# Altium schematic symbol library LATTICEPLDS_Library.SchLib: 291 symbols (part 31 of 32) (continued)
## ORLI10G (continued)
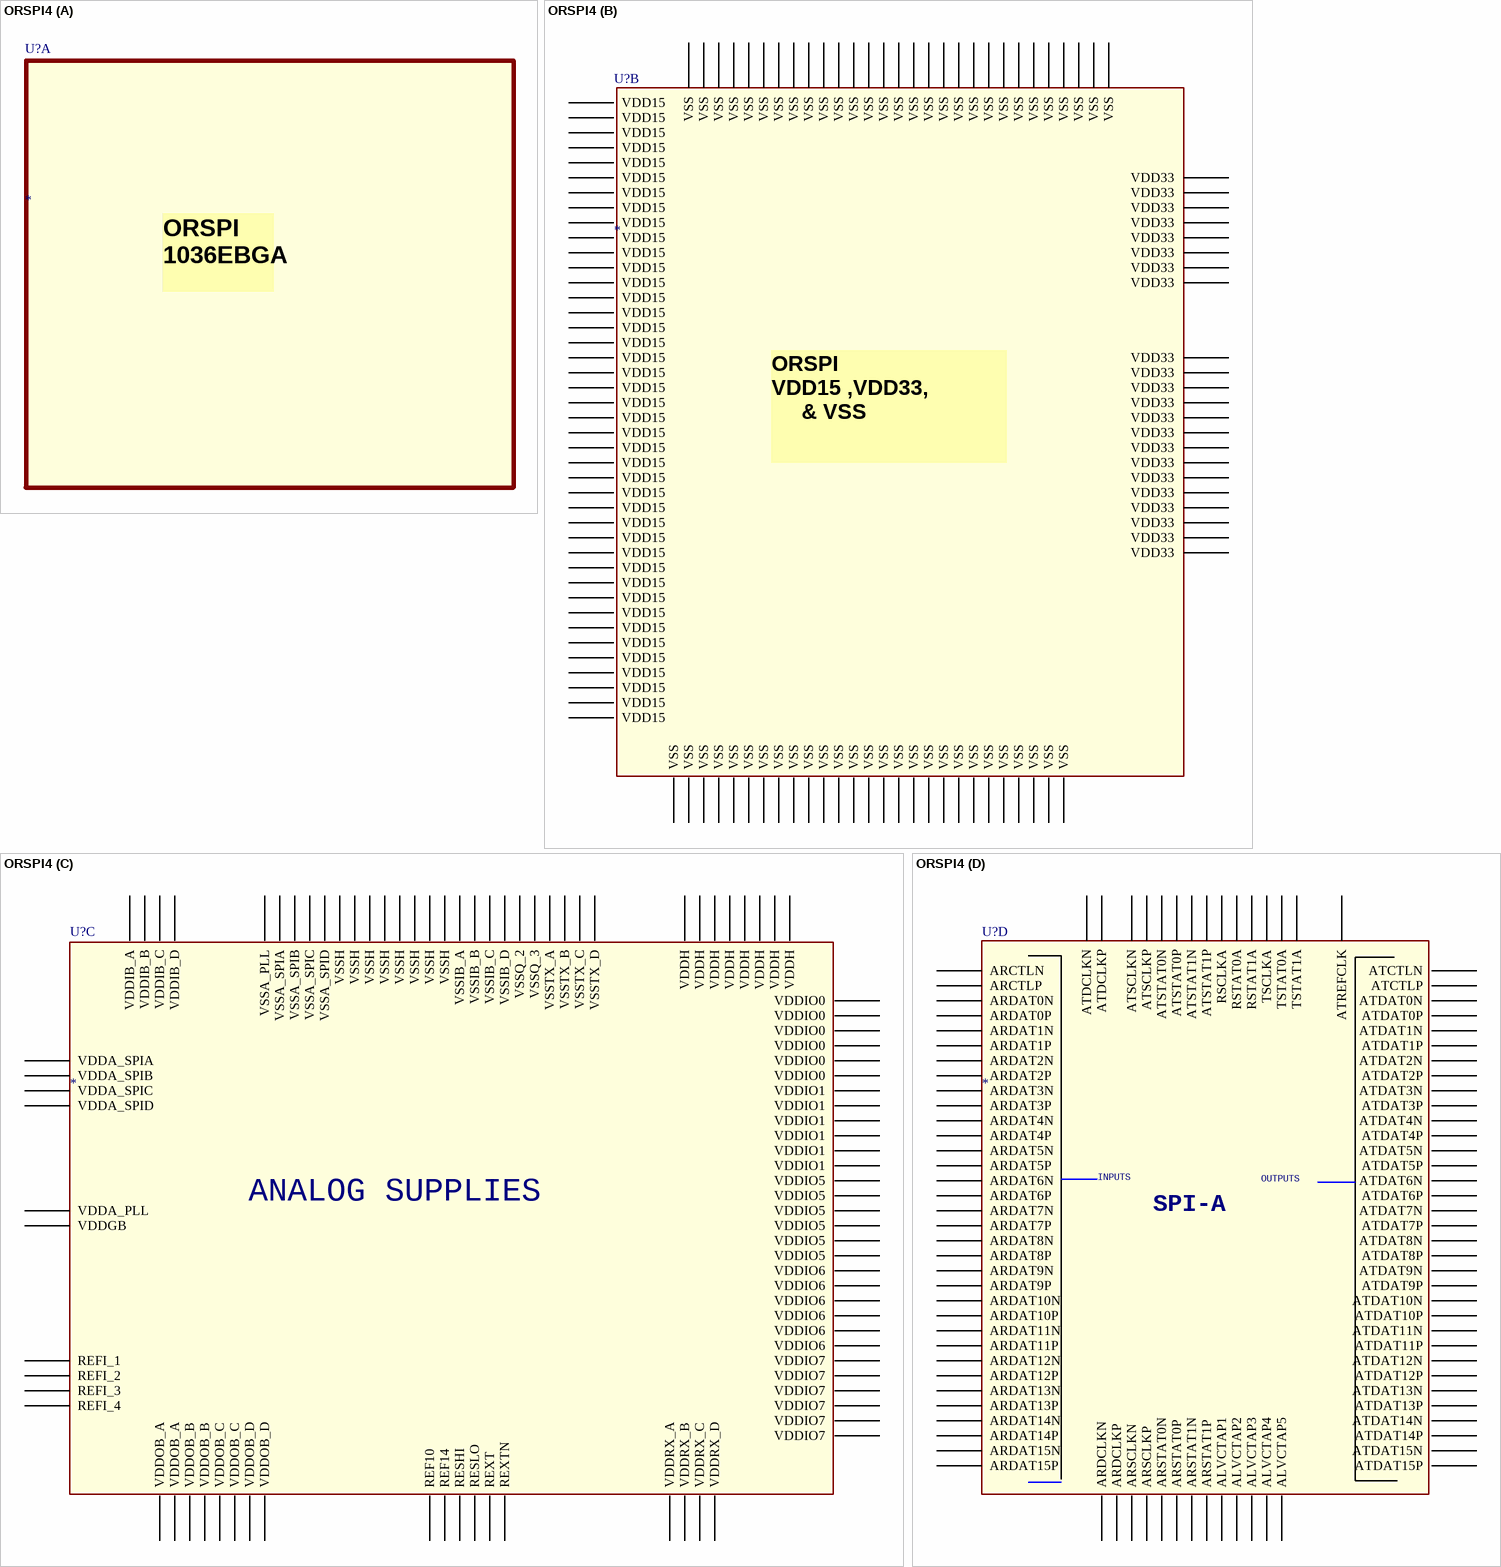
[diagram p291: symbol ORSPI4]
part P text: 3.3 VOLT PINS; 1.5 VOLT PINS; GROUND PINS
part Q text: TC; TL; CL; BL; BC

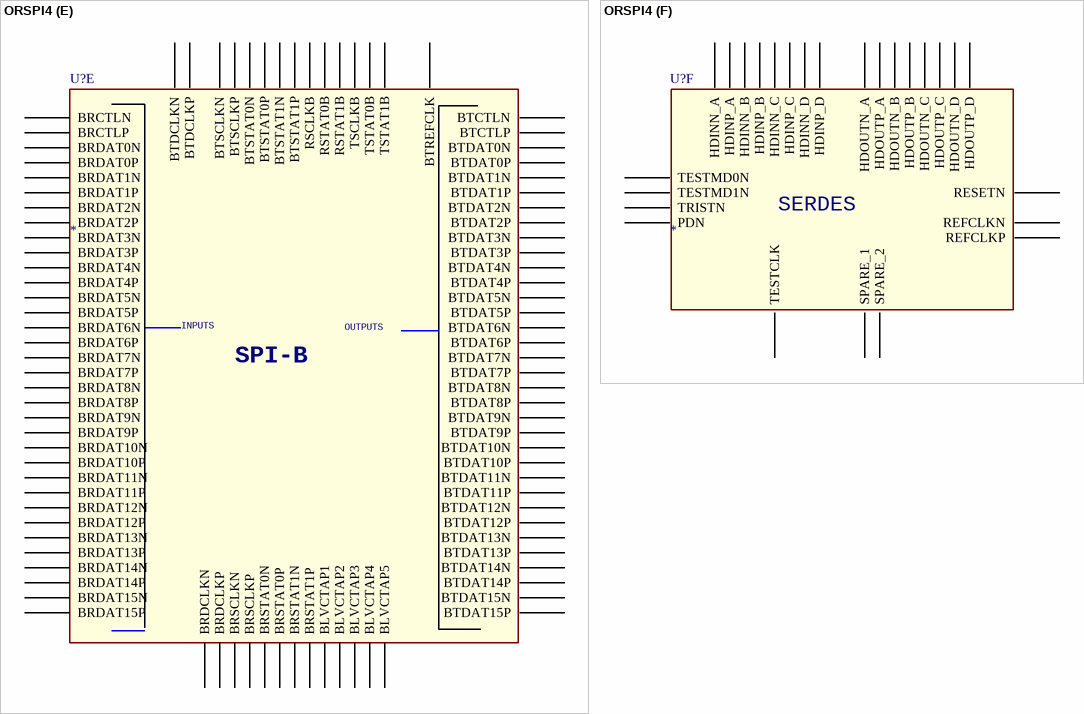
[diagram p292: symbol ORSPI4]

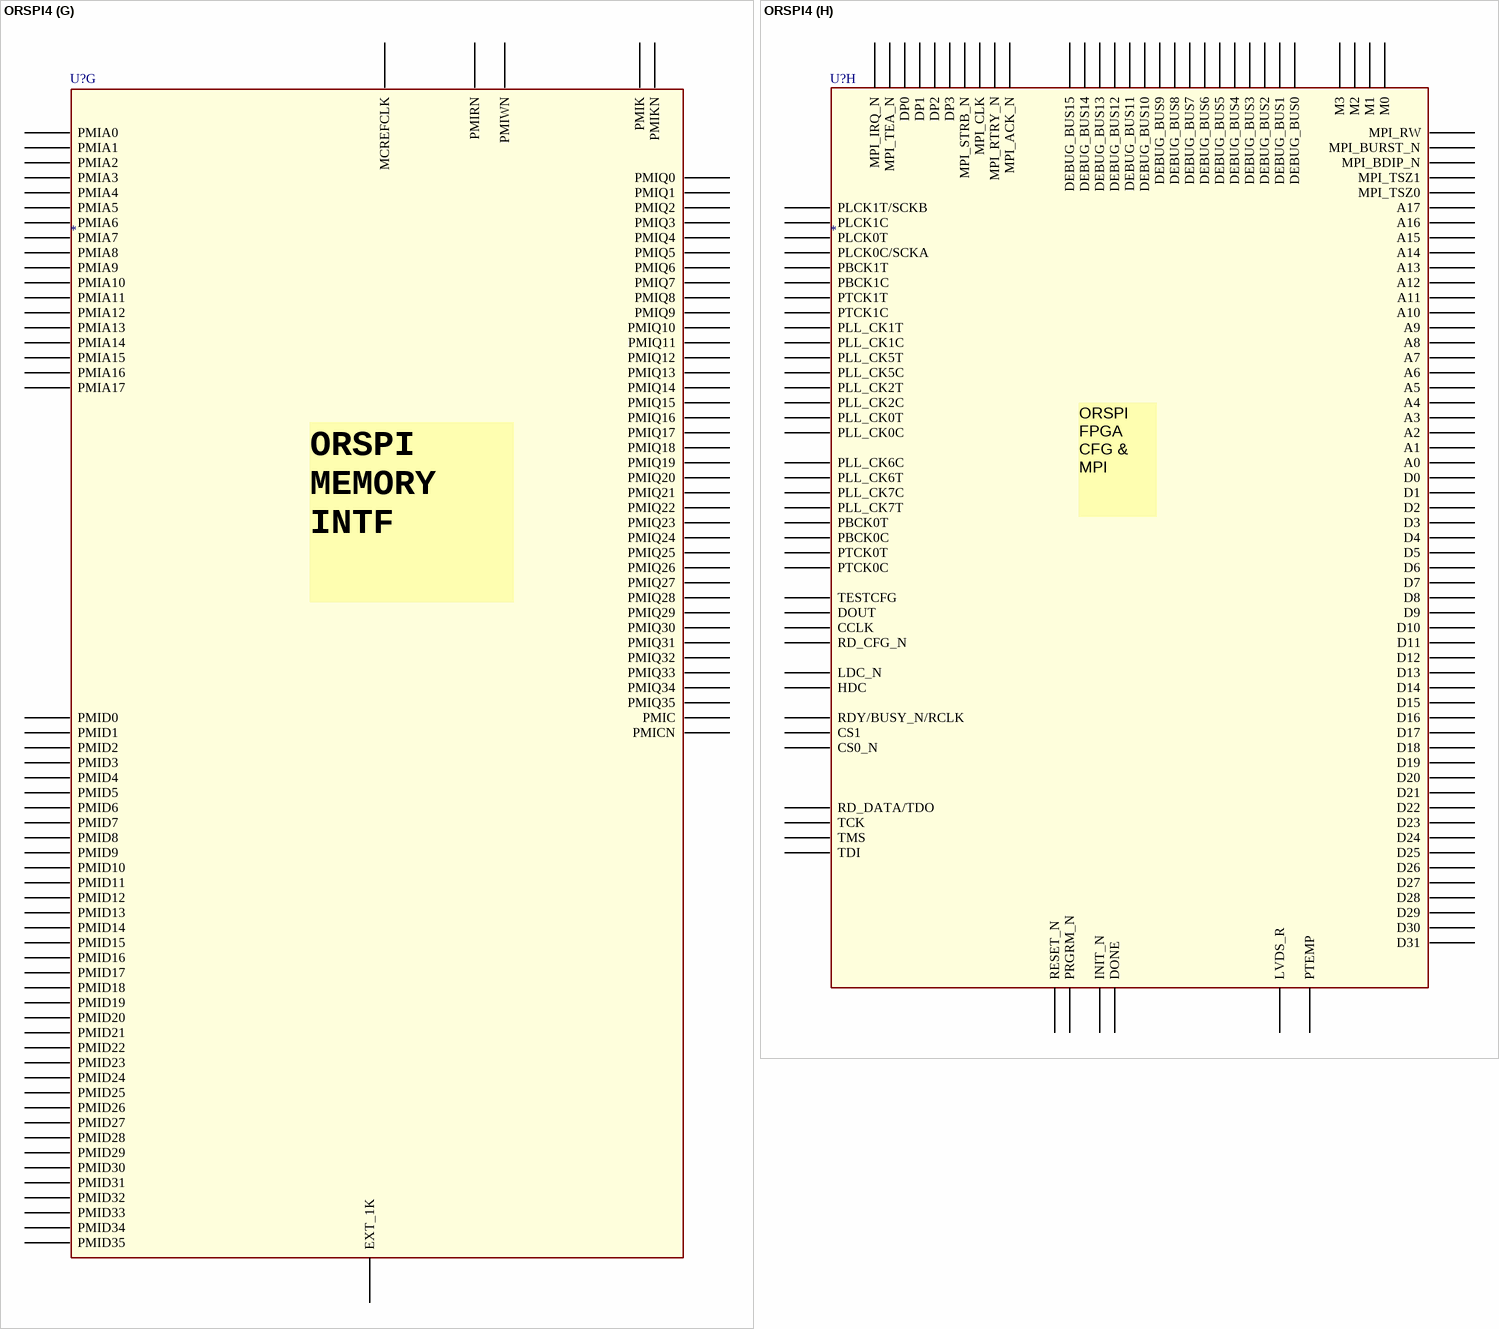
[diagram p293: symbol ORSPI4]

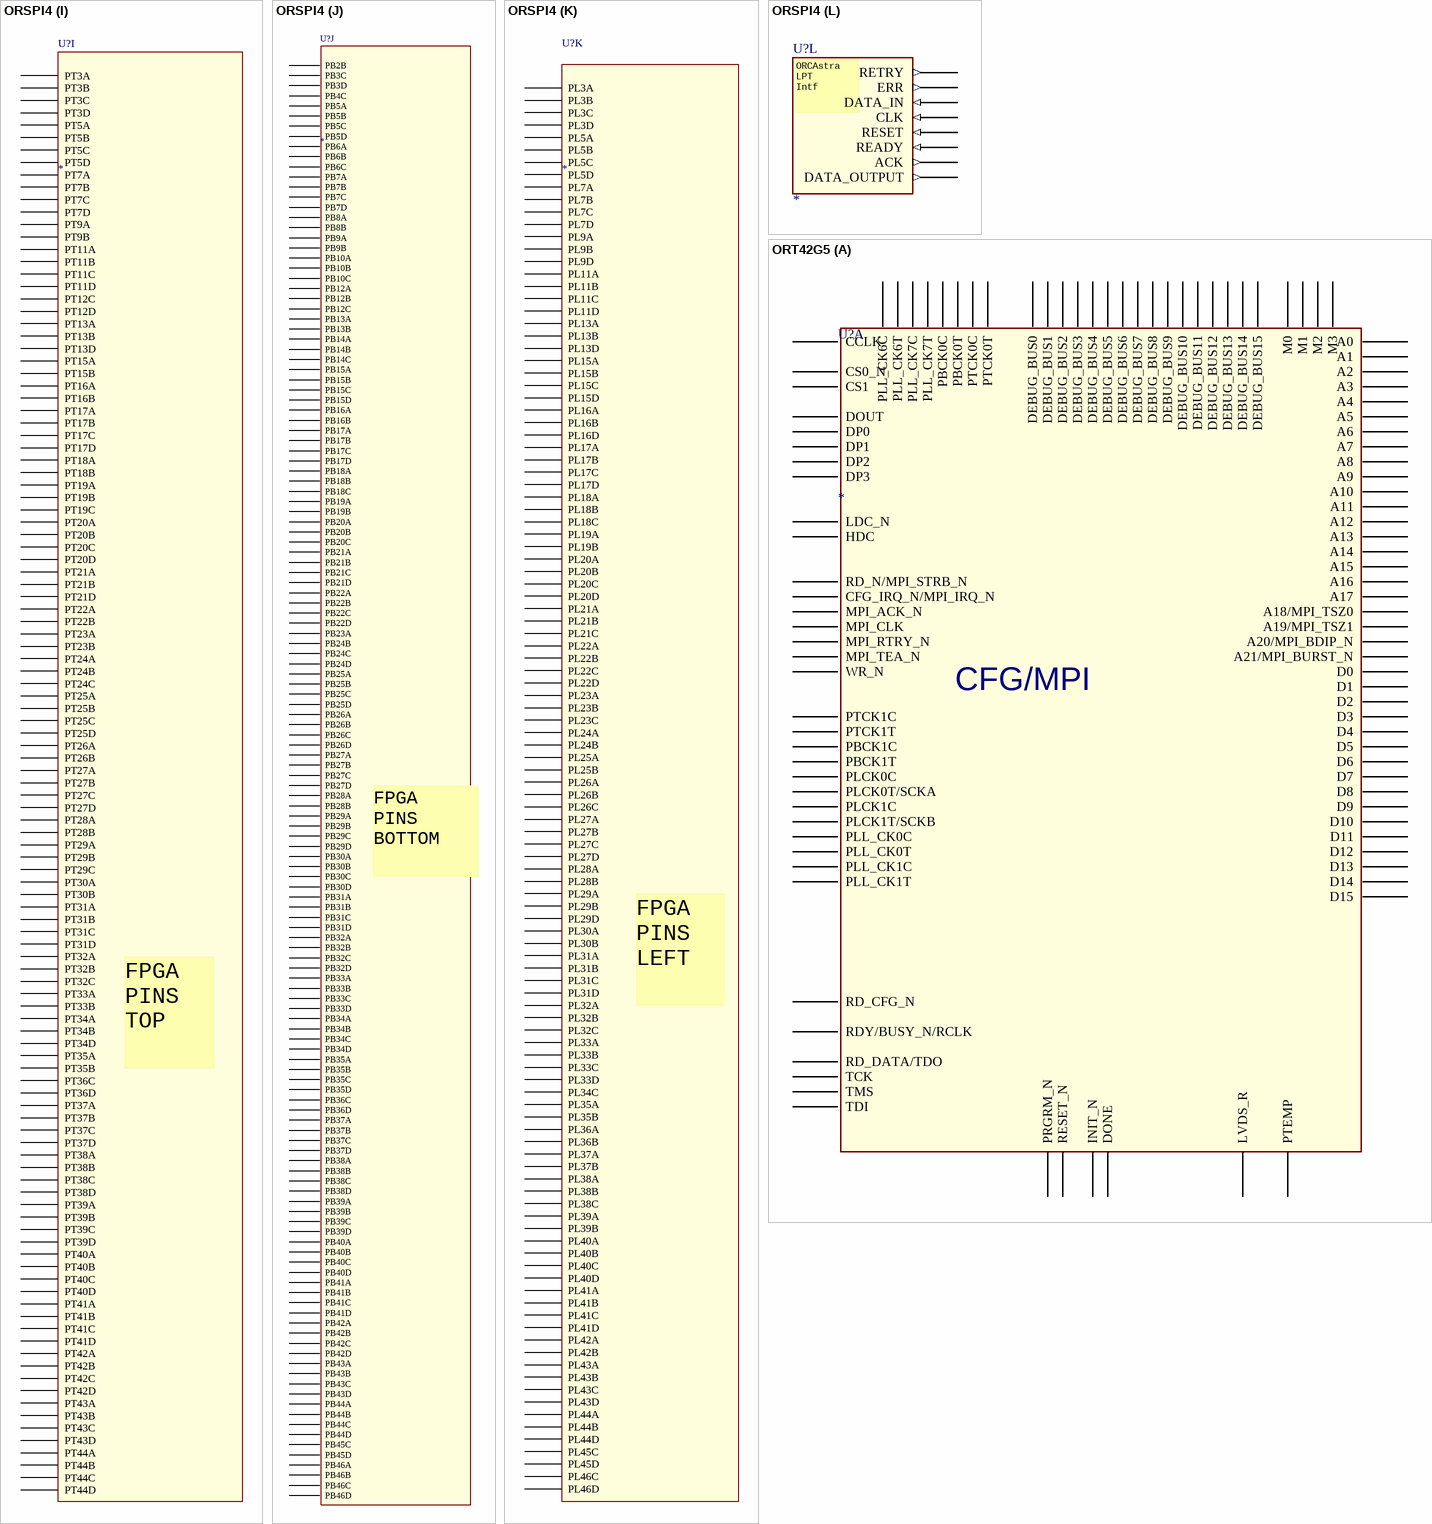
[diagram p294: symbols ORSPI4 to ORT42G5]

## ORSPI4
designator U?
footprint 1036fsbga
part B pins: A1 VSS (power), A2 VSS (power), A11 VSS (power), A19 VDD33 (power), A22 VSS (power), A33 VSS (power), A43 VSS (power), A44 VSS (power), AA7 VSS (power), AA38 VSS (power), AB1 VSS (power), AB6 VDD33 (power), AB7 VDD33 (power), AC7 VDD15 (power), AD7 VSS (power), AD38 VSS (power), AE7 VDD15 (power), AF6 VDD33 (power), AF7 VDD33 (power), AG7 VSS (power), AG38 VSS (power), AH6 VDD33 (power), AH7 VDD33 (power), AH38 VDD15 (power), AJ7 VDD15 (power), AK7 VSS (power), AK38 VSS (power), AL6 VDD33 (power), AL7 VDD33 (power), AL38 VDD15 (power), AM7 VDD15 (power), AN1 VSS (power), AN7 VSS (power), AN38 VSS (power), AN44 VSS (power), AP6 VDD33 (power), AP7 VDD33 (power), AP38 VDD15 (power), AR7 VDD15 (power), AT7 VDD15 (power), AT38 VDD15 (power), AU7 VDD15 (power), AU38 VDD15 (power), AV7 VSS (power), AV16 VDD15 (power), AV18 VSS (power), AV19 VDD15 (power), AV22 VSS (power), AV24 VSS (power), AV27 VSS (power), AV28 VDD15 (power), AV30 VSS (power), AV31 VDD15 (power), AV33 VSS (power), AV34 VDD15 (power), AV36 VDD15 (power), AV37 VDD15 (power), AV38 VSS (power), AV42 VDD33 (power), AY5 VDD15 (power), AY6 VDD15 (power), AY39 VDD15 (power), AY40 VDD15 (power), B1 VSS (power), B2 VSS (power), B19 VDD33 (power), B43 VSS (power), B44 VSS (power), BA42 VDD33 (power), BB3 VDD15 (power), BB4 VDD15 (power), BB41 VDD15 (power), BB42 VDD15 (power), BC1 VSS (power), BC2 VSS (power), BC11 VDD33 (power), BC22 VSS (power), BC43 VSS (power), BC44 VSS (power), BD1 VSS (power), BD2 VSS (power), BD7 VDD33 (power), BD11 VSS (power), BD22 VSS (power), BD33 VSS (power), BD43 VSS (power), BD44 VSS (power), C42 VDD15 (power), D42 VDD15 (power), E40 VDD15 (power), F40 VDD15 (power), G19 VDD15 (power), G20 VSS (power), G23 VSS (power), G25 VDD15 (power), G26 VSS (power), G29 VSS (power), G32 VSS (power), G34 VSS (power), G35 VDD15 (power), G37 VDD15 (power), H38 VDD15 (power), J38 VDD15 (power), J44 VDD33 (power), K41 VDD33 (power), L1 VSS (power), L44 VSS (power), M38 VSS (power), N38 VDD15 (power), R7 VDD15 (power), R38 VSS (power), T6 VDD33 (power), T7 VDD33 (power), T38 VDD15 (power), U7 VDD15 (power), V7 VSS (power), V38 VSS (power), W6 VDD33 (power), W7 VDD33 (power), Y7 VDD15 (power)
part C pins: A12 REFI_3 (power), A16 VDDA_PLL (power), AB38 VDDIO7 (power), AC38 VDDIO7 (power), AE38 VDDIO7 (power), AF38 VDDIO7 (power), AJ38 VDDIO6 (power), AK3 VSSA_SPIA (power), AK4 VDDA_SPIA (power), AM38 VDDIO6 (power), AP1 RESHI (power), AR1 REF14 (power), AR38 VDDIO6 (power), AU1 RESLO (power), AV8 VDDRX_A (power), AV10 VDDRX_D (power), AV11 REXT (power), AV12 VDDRX_C (power), AV14 VDDRX_B (power), AV17 VDDIO5 (power), AV20 VDDIO5 (power), AV21 VDDIO5 (power), AV23 VDDIO5 (power), AV25 VDDIO5 (power), AV26 VDDIO5 (power), AV29 VDDIO6 (power), AV32 VDDIO6 (power), AV35 VDDIO6 (power), AW8 VSSTX_D (power), AW9 VDDOB_A (power), AW10 VSSIB_D (power), AW11 VDDOB_B (power), AW12 VSSTX_C (power), AW13 VDDOB_C (power), AW14 VSSIB_C (power), AW15 VDDOB_D (power), BA2 REF10 (power), BA7 REXTN (power), BB8 VDDIB_A (power), BB9 VDDOB_A (power), BB10 VDDIB_B (power), BB11 VDDOB_B (power), BB12 VDDIB_C (power), BB13 VDDOB_C (power), BB14 VDDIB_D (power), BB15 VDDOB_D (power), BC9 VSSTX_B (power), BC10 VSSIB_B (power), BD6 VDDGB (power), BD9 VSSTX_A (power), BD10 VSSIB_A (power), C17 VSSA_PLL (power), D3 REFI_1 (power), D4 VSSH (power), D10 REFI_2 (power), D16 REFI_4 (power), E5 VSSH (power), F6 VDDH (power), G7 VDDH (power), G9 VSSH (power), G10 VDDH (power), G12 VDDH (power), G13 VSSH (power), G14 VDDH (power), G15 VSSH (power), G16 VDDH (power), G17 VDDIO1 (power), G18 VDDIO1 (power), G21 VDDIO1 (power), G24 VDDIO1 (power), G27 VDDIO1 (power), G28 VDDIO1 (power), G30 VDDIO0 (power), G31 VDDIO0 (power), G36 VDDIO0 (power), G38 VDDIO0 (power), J7 VDDH (power), K5 VSSA_SPID (power), K7 VSSH (power), L6 VDDA_SPID (power), M7 VSSH (power), N7 VDDH (power), P7 VSSH (power), P38 VDDIO0 (power), T4 VSSQ_3 (power), U1 VSSA_SPIB (power), U5 VDDA_SPIC (power), U6 VSSA_SPIC (power), U38 VDDIO0 (power), V1 VDDA_SPIB (power), W1 VSSQ_2 (power), W38 VDDIO7 (power), Y38 VDDIO7 (power)
part D pins: AA1 ATDAT14N, AA2 ATDAT14P, AA3 ATDAT12N, AA4 ATDAT12P, AA5 ATDCLKN, AA6 ATDAT6N, AB2 ATDAT13N, AB3 ATDAT13P, AB4 ATDAT8P, AB5 ATDAT8N, AC1 ATDAT15N, AC2 ATDAT15P, AN5 ARSTAT1P, AN6 ARSTAT1N, AU6 ATSTAT0N, AV1 ARSCLKP, AV2 ATSCLKP, AV3 ATSCLKN, AV6 ATSTAT0P, AV9 ALVCTAP5, AW1 ARSCLKN, AW3 ATSTAT1P, AW4 ATSTAT1N, BA5 ARSTAT0N, BA6 ARSTAT0P, BD5 ATREFCLK, D1 RSTAT0A, E1 TSCLKA, F1 TSTAT1A, G1 ALVCTAP3, G2 ARDAT1N, G3 ARDAT1P, H1 ARDAT3N, H2 ARDAT3P, H3 ALVCTAP4, H4 RSTAT1A, J1 ARDAT4N, J2 ARDAT4P, J3 ARDAT5P, J4 ARDAT0P, K1 ARDAT6N, K2 ARDAT6P, K3 ARDAT5N, K4 ARDAT0N, K6 RSCLKA, L2 ARCTLN, L3 ARCTLP, L4 ARDAT2P, L5 ARDAT2N, L7 TSTAT0A, M1 ARDAT8N, M2 ARDAT8P, M3 ARDAT14N, M4 ARDAT14P, M5 ARDAT7P, M6 ARDAT7N, N1 ARDAT11N, N2 ARDAT11P, N3 ARDAT10N, N4 ARDAT10P, N5 ARDAT9N, N6 ARDAT9P, P1 ARDCLKN, P2 ARDCLKP, P3 ARDAT13N, P4 ARDAT13P, P5 ARDAT12N, P6 ARDAT12P, R1 ATDAT5P, R2 ATDAT3P, R3 ATDAT1P, R4 ATDAT0N, R5 ATDAT0P, R6 ALVCTAP2, T1 ATDAT5N, T2 ATDAT3N, T3 ATDAT1N, T5 ALVCTAP1, U2 ATDAT10P, U3 ATDAT4P, U4 ATDAT2P, V2 ATDAT10N, V3 ATDAT4N, V4 ATDAT2N, V5 ARDAT15N, V6 ARDAT15P, W2 ATCTLN, W3 ATCTLP, W4 ATDAT7N, W5 ATDAT7P, Y1 ATDAT11N, Y2 ATDAT11P, Y3 ATDAT9N, Y4 ATDAT9P, Y5 ATDCLKP, Y6 ATDAT6P
part E pins: AC3 BRDAT1P, AC4 BRDAT1N, AC5 BRDAT3P, AC6 BRDAT3N, AD1 BRDAT0P, AD2 BRDAT0N, AD3 BRDAT4P, AD4 BRDAT4N, AD5 BRDAT6P, AD6 BRDAT6N, AE1 BRDAT2P, AE2 BRDAT2N, AE3 BRCTLP, AE4 BRCTLN, AE5 BRDAT9P, AE6 BRDAT9N, AF1 BLVCTAP1, AF2 BRDAT11P, AF3 BRDAT11N, AF4 BLVCTAP2, AF5 BLVCTAP4, AG1 BRDAT5P, AG2 BRDAT5N, AG3 BRDAT13P, AG4 BRDAT13N, AG5 BRDCLKP, AG6 BRDCLKN, AH1 BRDAT7P, AH2 BTDAT1P, AH3 BTDAT1N, AH4 BTDAT3P, AH5 BTDAT3N, AJ1 BRDAT7N, AJ2 BRDAT8P, AJ3 BTDAT5P, AJ4 BTDAT5N, AJ5 BTDAT6P, AJ6 BTDAT6N, AK1 BRDAT10P, AK2 BRDAT8N, AK5 BTCTLP, AK6 BTCTLN, AL1 BRDAT10N, AL2 BTDAT9P, AL3 BTDAT9N, AL4 BTDAT11P, AL5 BTDAT11N, AM1 BRDAT12P, AM2 BRDAT12N, AM3 BTDAT13P, AM4 BTDAT13N, AM5 BTDAT15P, AM6 BTDAT15N, AN2 BLVCTAP3, AN3 BRDAT14P, AN4 BRDAT14N, AP2 BRDAT15P, AP3 BTDAT0P, AP4 BRSCLKP, AP5 BRSCLKN, AR2 BRDAT15N, AR3 BTDAT0N, AR4 BRSTAT1P, AR5 BRSTAT1N, AR6 BLVCTAP5, AT1 BTDAT2P, AT2 BTDAT2N, AT3 BTSTAT1P, AT4 BTSTAT1N, AT5 BTDAT4P, AT6 BTDAT4N, AU2 BTDAT7P, AU3 BTDAT7N, AU4 BTDCLKP, AU5 BTDCLKN, AV4 BTDAT8P, AV5 BTDAT8N, AV13 TSTAT0B, AW2 BTSCLKP, AW5 BTDAT10N, AW6 BTDAT10P, AY1 BRSTAT0P, AY2 BTSCLKN, AY3 BTDAT12P, AY4 BTDAT12N, BA1 BRSTAT0N, BA3 BTDAT14P, BA4 BTDAT14N, BB5 BTSTAT0N, BB6 BTSTAT0P, BB7 TSCLKB, BC3 TSTAT1B, BC4 RSTAT0B, BC5 RSCLKB, BC6 RSTAT1B, BD3 BTREFCLK
part F pins: AV15 TESTMD1N, AW7 REFCLKP, AY7 REFCLKN, AY8 HDINP_A, AY9 HDOUTP_A, AY10 HDINP_B, AY11 HDOUTP_B, AY12 HDINP_C, AY13 HDOUTP_C, AY14 HDINP_D, AY15 HDOUTP_D, BA8 HDINN_A, BA9 HDOUTN_A, BA10 HDINN_B, BA11 HDOUTN_B, BA12 HDINN_C, BA13 HDOUTN_C, BA14 HDINN_D, BA15 HDOUTN_D, BB1 RESETN, BB2 TRISTN, BC7 PDN, BC8 TESTMD0N, BD4 TESTCLK, BD8 SPARE_1, C16 SPARE_2
part G pins: A3 PMID22, A4 PMID20, A5 PMID3, A6 PMIQ31, A7 PMIQ35, A8 PMIQ33, A9 PMID18, A10 PMID14, A13 PMIQ32, A14 PMIQ24, A15 PMIQ16, A17 PMIQ5, A18 PMIQ3, B3 PMID26, B4 PMID24, B5 PMID17, B6 PMID7, B7 PMID5, B8 PMID1, B9 PMID23, B10 PMIKN, B11 PMID12, B12 PMID0, B13 PMIQ34, B14 PMIQ26, B15 PMIQ18, B16 PMIQ13, B17 PMIQ7, B18 PMIQ1, C1 PMIA3, C2 EXT_1K, C3 PMIA2, C4 PMIA15, C5 PMID33, C6 PMID29, C7 PMID21, C8 PMID19, C9 PMID11, C10 PMID16, C11 PMID10, C12 PMID4, C13 PMIC, C14 PMIQ30, C15 PMIQ22, C18 PMIQ0, D2 PMIRN, D5 PMID34, D6 PMID32, D7 PMID35, D8 PMID27, D9 PMID15, D11 PMID8, D12 PMID2, D13 PMICN, D14 PMIQ28, D15 PMIQ20, D17 PMIQ9, D18 PMIQ2, E2 PMIA13, E3 PMIWN, E4 PMIA7, E6 PMIA0, E7 PMID28, E8 PMID25, E9 PMID13, E10 PMIQ23, E11 PMID6, E12 PMIQ19, E13 MCREFCLK, E14 PMIQ14, E15 PMIQ11, E16 PMIQ8, E17 PMIQ4, F2 PMIA17, F3 PMIA11, F4 PMIA9, F5 PMIA1, F7 PMID30, F8 PMIK, F9 PMID9, F10 PMIQ25, F11 PMIQ29, F12 PMIQ21, F13 PMIQ17, F14 PMIQ15, F15 PMIQ12, F16 PMIQ10, F17 PMIQ6, G4 PMIA14, G5 PMIA12, G6 PMIA6, G8 PMID31, G11 PMIQ27, H5 PMIA8, H6 PMIA5, H7 PMIA4, J5 PMIA16, J6 PMIA10
part H pins: A24 DEBUG_BUS13, A26 DEBUG_BUS8, A27 DEBUG_BUS5, A28 DEBUG_BUS3, A30 PTCK1C, A34 MPI_RTRY_N, A35 MPI_CLK, A36 M2, AA42 A11, AB42 MPI_STRB_N, AC41 A9, AC42 A10, AC43 PLCK0T, AC44 PLCK0C/SCKA, AD44 A8, AE41 A7, AE43 PLCK1T/SCKB, AE44 PLCK1C, AF43 A5, AF44 A6, AH44 MPI_RW, AJ41 A2, AJ42 A3, AJ44 A4, AK43 A0, AK44 A1, AL42 D8, AL43 DP1, AL44 DP0, AM41 D10, AM42 D9, AP41 D12, AP42 D11, AR39 PTEMP, AT39 PLL_CK7T, AT40 PLL_CK7C, AT42 D13, B25 DEBUG_BUS10, B26 DEBUG_BUS9, B27 DEBUG_BUS6, B28 DEBUG_BUS4, B29 DEBUG_BUS2, B30 PTCK1T, B31 DEBUG_BUS1, B34 MPI_ACK_N, B35 MPI_BURST_N, B36 M3, B39 D0, B40 TMS, B41 MPI_BDIP_N, B42 MPI_TSZ1, BA25 PBCK1T, BA31 D26, BA33 D23, BA34 D20, BA35 D17, BB25 PBCK1C, BB29 D31, BB30 D28, BB31 D27, BB32 D25, BB33 D24, BB34 D21, BB35 D18, BB43 DP2, BC14 PLL_CK5C, BC15 PLL_CK5T, BC28 PBCK0T, BC30 D29, BC33 LVDS_R, BC36 D15, BC42 PLL_CK6T, BD28 PBCK0C, BD30 D30, BD34 D22, BD35 D19, BD36 D16, BD37 D14, BD40 DP3, BD42 PLL_CK6C, C24 DEBUG_BUS15, C25 DEBUG_BUS12, C27 DEBUG_BUS7, C30 PTCK0T, C32 DEBUG_BUS0, C34 M0, C39 MPI_TSZ0, C40 D3, C44 PLL_CK1C, D24 DEBUG_BUS14, D25 DEBUG_BUS11, D30 PTCK0C, D34 M1, D36 MPI_TEA_N, D44 PLL_CK1T, E18 PLL_CK2C, E39 D1, E41 TDI, E42 TCK, F18 PLL_CK2T, F39 D2, J43 RESET_N, K38 MPI_IRQ_N, K39 CCLK, K40 DONE, K42 RD_DATA/TDO, K43 RD_CFG_N, K44 PRGRM_N, M41 PLL_CK0T, M42 PLL_CK0C, N41 D6, N42 D5, P43 LDC_N, P44 HDC, R41 A17, R43 D7, R44 TESTCFG, T43 CS1, T44 CS0_N, U41 A16, U43 DOUT, U44 INIT_N, V43 A14, V44 A15, W43 D4, Y41 A12, Y42 A13, Y44 RDY/BUSY_N/RCLK
part I pins: A20 PT42C, A21 PT40C, A23 PT36C, A25 PT32C, A29 PT24C, A31 PT21D, A32 PT20D, A37 PT26B, A38 PT22B, A39 PT12D, A40 PT12C, A41 PT11D, A42 PT11C, B20 PT42D, B21 PT40D, B22 PT38C, B23 PT36D, B24 PT34D, B32 PT20C, B33 PT17D, B37 PT26A, B38 PT22A, C20 PT44D, C21 PT41D, C22 PT38D, C23 PT37D, C26 PT31D, C28 PT27D, C29 PT25D, C31 PT35B, C33 PT17C, C35 PT27B, C36 PT13D, C37 PT24B, C38 PT21B, C41 PT5D, C43 PT3D, D20 PT44C, D21 PT41C, D22 PT39D, D23 PT37C, D26 PT31C, D27 PT29C, D28 PT27C, D29 PT25C, D31 PT35A, D32 PT19C, D33 PT31B, D35 PT27A, D37 PT24A, D38 PT21A, D39 PT7D, D40 PT7C, D41 PT5C, D43 PT3C, E20 PT43D, E22 PT39C, E23 PT44B, E24 PT43B, E25 PT40B, E26 PT41B, E27 PT37B, E28 PT39B, E29 PT38B, E30 PT33B, E31 PT34B, E32 PT32B, E33 PT31A, E34 PT29B, E35 PT28B, E36 PT25B, E37 PT23B, E38 PT20B, E43 PT19B, E44 PT19A, F20 PT43C, F22 PT42B, F23 PT44A, F24 PT43A, F25 PT40A, F26 PT41A, F27 PT37A, F28 PT39A, F29 PT38A, F30 PT33A, F31 PT34A, F32 PT32A, F33 PT30B, F34 PT29A, F35 PT28A, F36 PT25A, F37 PT23A, F38 PT20A, F41 PT17B, F42 PT17A, F43 PT18A, F44 PT18B, G22 PT42A, G33 PT30A, G39 PT16B, G40 PT16A, G41 PT13B, G42 PT13A, G43 PT11B, G44 PT11A, H39 PT15A, H40 PT15B, H41 PT3A, H42 PT3B, H43 PT9A, H44 PT9B, J39 PT5A, J40 PT5B, J41 PT7A, J42 PT7B
part J pins: AU39 PB9B, AU40 PB9A, AV39 PB13A, AV40 PB10B, AV41 PB7B, AW16 PB43B, AW17 PB42B, AW18 PB41B, AW19 PB40B, AW20 PB39B, AW21 PB37B, AW22 PB35A, AW23 PB33A, AW24 PB34A, AW25 PB32A, AW26 PB31A, AW27 PB30A, AW28 PB29A, AW29 PB28A, AW30 PB27A, AW31 PB26A, AW32 PB25A, AW33 PB23A, AW34 PB22A, AW35 PB21A, AW36 PB20A, AW37 PB19A, AW38 PB17A, AW39 PB13B, AW40 PB10A, AW41 PB7A, AW42 PB6A, AW43 PB5A, AY16 PB43A, AY17 PB42A, AY18 PB41A, AY19 PB40A, AY20 PB39A, AY21 PB37A, AY22 PB35B, AY23 PB33B, AY24 PB34B, AY25 PB32B, AY26 PB31B, AY27 PB30B, AY28 PB29B, AY29 PB28B, AY30 PB27B, AY31 PB26B, AY32 PB25B, AY33 PB24B, AY34 PB22B, AY35 PB21B, AY36 PB20B, AY37 PB19B, AY38 PB17B, AY41 PB8A, AY42 PB6B, AY43 PB5B, BA16 PB45D, BA17 PB43D, BA18 PB41D, BA19 PB39D, BA20 PB37D, BA21 PB38A, BA22 PB34C, BA23 PB32C, BA24 PB30C, BA26 PB26C, BA27 PB24C, BA28 PB22C, BA29 PB20C, BA30 PB18C, BA32 PB14C, BA36 PB7C, BA37 PB5C, BA38 PB16B, BA39 PB14B, BA40 PB12A, BA41 PB8B, BA43 PB2B, BB16 PB45C, BB17 PB43C, BB18 PB41C, BB19 PB39C, BB20 PB37C, BB21 PB38B, BB22 PB34D, BB23 PB32D, BB24 PB30D, BB26 PB26D, BB27 PB24D, BB28 PB22D, BB36 PB7D, BB37 PB5D, BB38 PB16A, BB39 PB14A, BB40 PB12B, BC12 PB46B, BC13 PB44B, BC16 PB44D, BC17 PB42D, BC18 PB40D, BC19 PB38D, BC20 PB36D, BC21 PB35D, BC23 PB33C, BC24 PB31C, BC25 PB29C, BC26 PB27C, BC27 PB25C, BC29 PB21C, BC31 PB17C, BC32 PB15C, BC34 PB12C, BC35 PB10C, BC37 PB6C, BC38 PB18A, BC39 PB15A, BC40 PB4C, BC41 PB3C, BD12 PB46A, BD13 PB44A, BD14 PB46C, BD15 PB46D, BD16 PB44C, BD17 PB42C, BD18 PB40C, BD19 PB38C, BD20 PB36C, BD21 PB35C, BD23 PB33D, BD24 PB31D, BD25 PB29D, BD26 PB27D, BD27 PB25D, BD29 PB21D, BD31 PB17D, BD32 PB15D, BD38 PB18B, BD39 PB15B, BD41 PB3D
part K pins: AA39 PL21A, AA40 PL21B, AA41 PL21C, AA43 PL20C, AA44 PL20D, AB39 PL22A, AB40 PL22B, AB41 PL23C, AB43 PL22C, AB44 PL22D, AC39 PL23A, AC40 PL23B, AD39 PL24A, AD40 PL24B, AD41 PL27C, AD42 PL27D, AD43 PL26C, AE39 PL25A, AE40 PL25B, AE42 PL29D, AF39 PL26A, AF40 PL26B, AF41 PL31C, AF42 PL31D, AG39 PL29A, AG40 PL29B, AG41 PL28A, AG42 PL28B, AG43 PL27A, AG44 PL27B, AH39 PL30A, AH40 PL30B, AH41 PL33C, AH42 PL33D, AH43 PL32C, AJ39 PL31A, AJ40 PL31B, AJ43 PL34C, AK39 PL33A, AK40 PL33B, AK41 PL32A, AK42 PL32B, AL39 PL36A, AL40 PL36B, AL41 PL38C, AM39 PL40C, AM40 PL40D, AM43 PL35A, AM44 PL35B, AN39 PL39A, AN40 PL39B, AN41 PL41A, AN42 PL41B, AN43 PL37B, AP39 PL40A, AP40 PL40B, AP43 PL37A, AP44 PL41D, AR40 PL45C, AR41 PL45D, AR42 PL38A, AR43 PL38B, AR44 PL41C, AT41 PL46C, AT43 PL42A, AT44 PL42B, AU41 PL46D, AU42 PL44D, AU43 PL43C, AU44 PL43D, AV43 PL43A, AV44 PL43B, AW44 PL44B, AY44 PL44A, L38 PL3B, L39 PL3A, L40 PL5B, L41 PL5A, L42 PL7B, L43 PL7A, M39 PL3C, M40 PL3D, M43 PL9B, M44 PL9A, N39 PL5C, N40 PL5D, N43 PL11A, N44 PL11B, P39 PL13A, P40 PL13B, P41 PL7C, P42 PL7D, R39 PL15A, R40 PL15B, R42 PL9D, T39 PL16A, T40 PL16B, T41 PL11C, T42 PL11D, U39 PL17A, U40 PL17B, U42 PL13D, V39 PL18A, V40 PL18B, V41 PL15C, V42 PL15D, W39 PL19A, W40 PL19B, W41 PL17C, W42 PL17D, W44 PL16D, Y39 PL20A, Y40 PL20B, Y43 PL18C
part L pins: BA44 RETRY (out), BB44 ERR (out), C19 DATA_IN (in), D19 CLK (in), E19 ACK (out), E21 RESET (in), F19 DATA_OUTPUT (out), F21 READY (in)
part A text: ORSPI / 1036EBGA
part B text: ORSPI / VDD15 ,VDD33, / & VSS
part C text: ANALOG SUPPLIES
part D text: INPUTS; OUTPUTS; SPI-A
part E text: INPUTS; OUTPUTS; SPI-B
part F text: SERDES
part G text: ORSPI / MEMORY / INTF
part H text: ORSPI / FPGA / CFG & / MPI
part I text: FPGA / PINS / TOP
part J text: FPGA / PINS / BOTTOM
part K text: FPGA / PINS / LEFT
part L text: ORCAstra / LPT / Intf

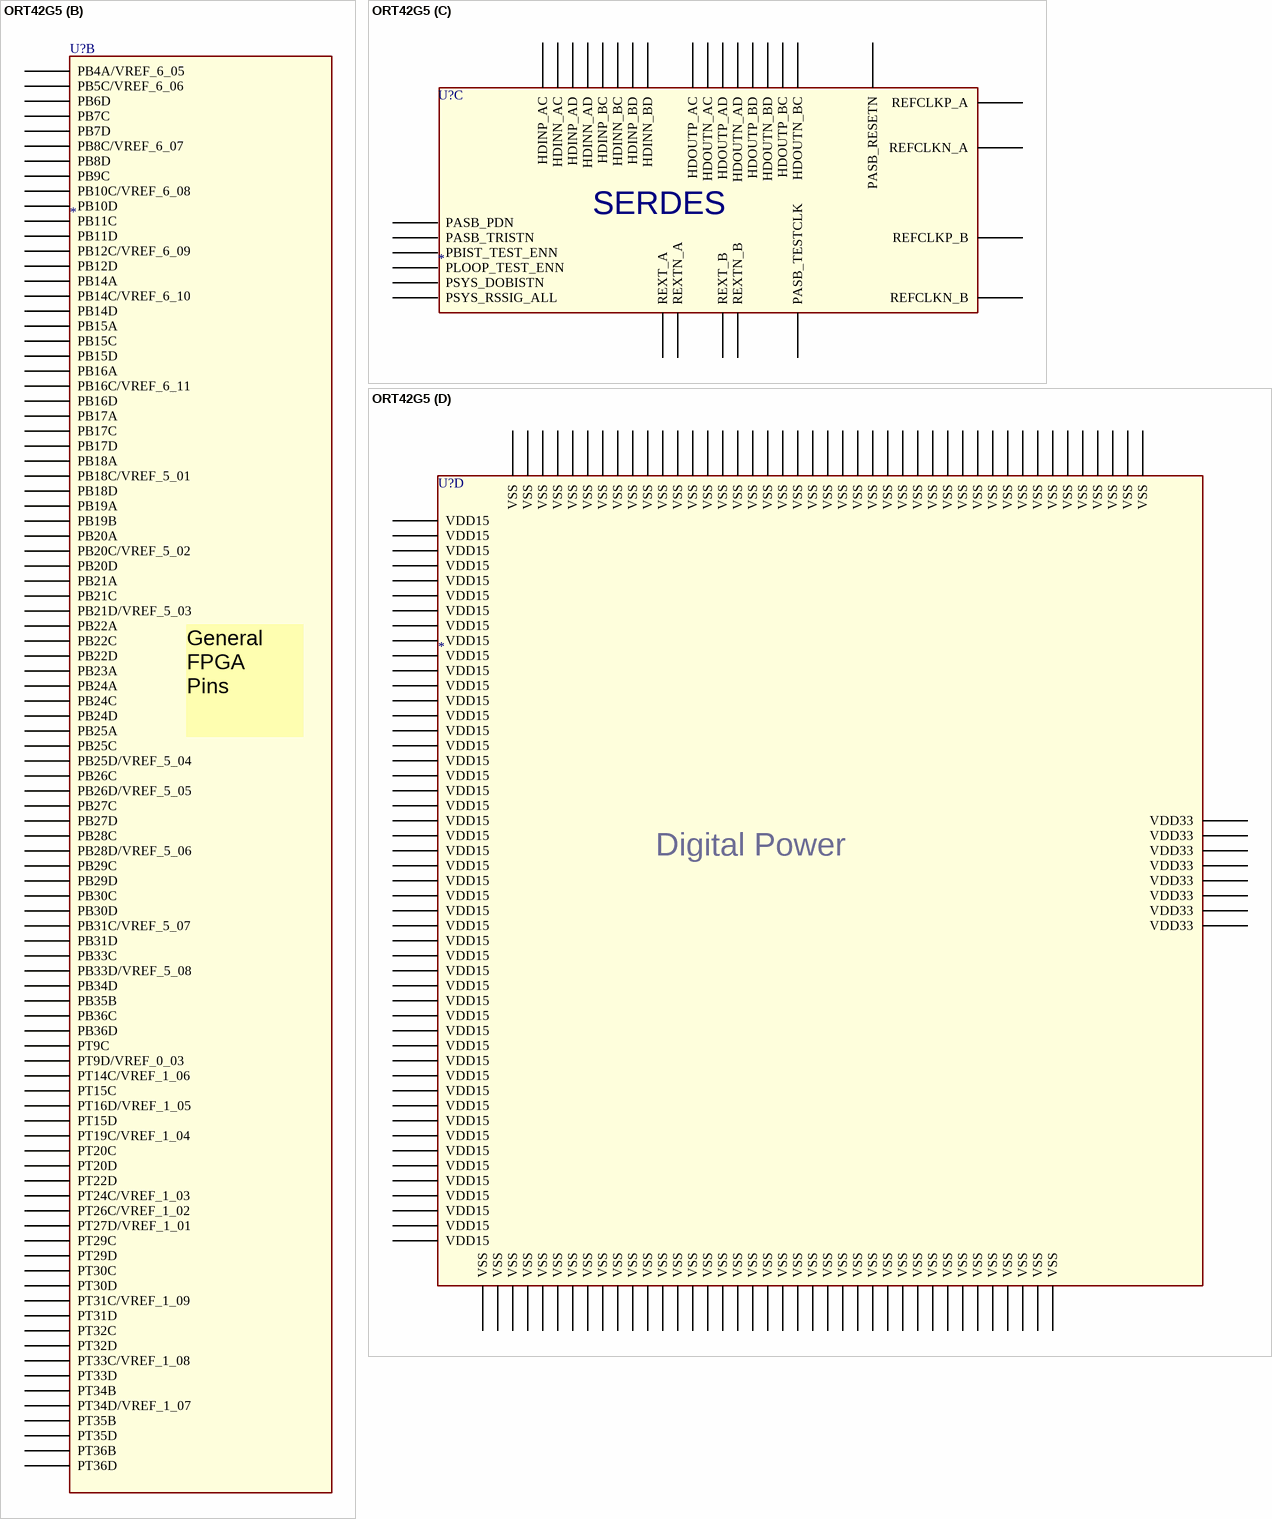
[diagram p295: symbol ORT42G5]

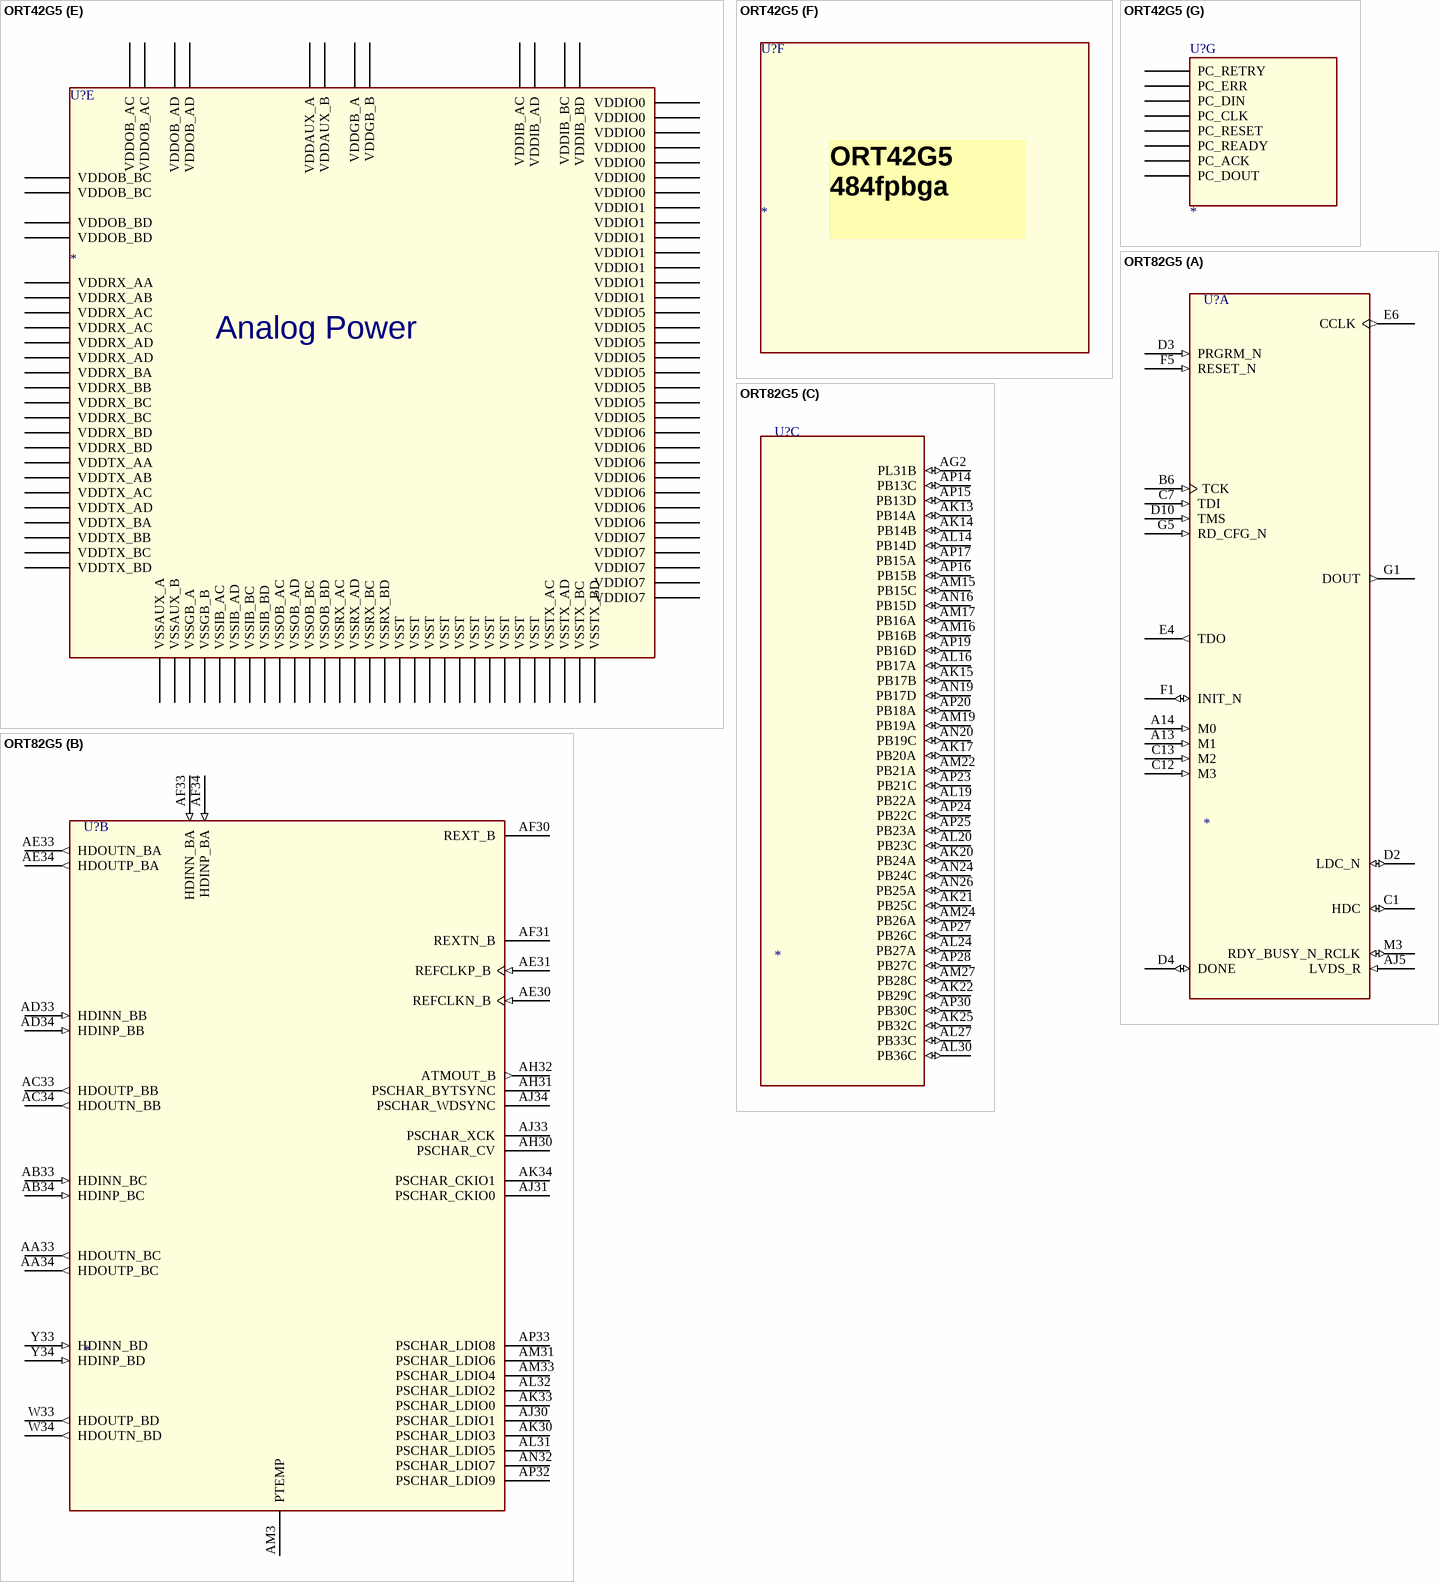
[diagram p296: symbols ORT42G5 to ORT82G5]